# Altium footprint library Cty1.PcbLib: 1378 footprints (part 26 of 87)
Each footprint in its own frame and in the unit in brackets; x right, y up, seen from the top. Pads: shape width x height; smd on the part's side, far side on the other; paste and mask are expansions set on the pad; w line width, h text height; cw(c..) or ccw(c..) is an arc to the next point about the centre after c.
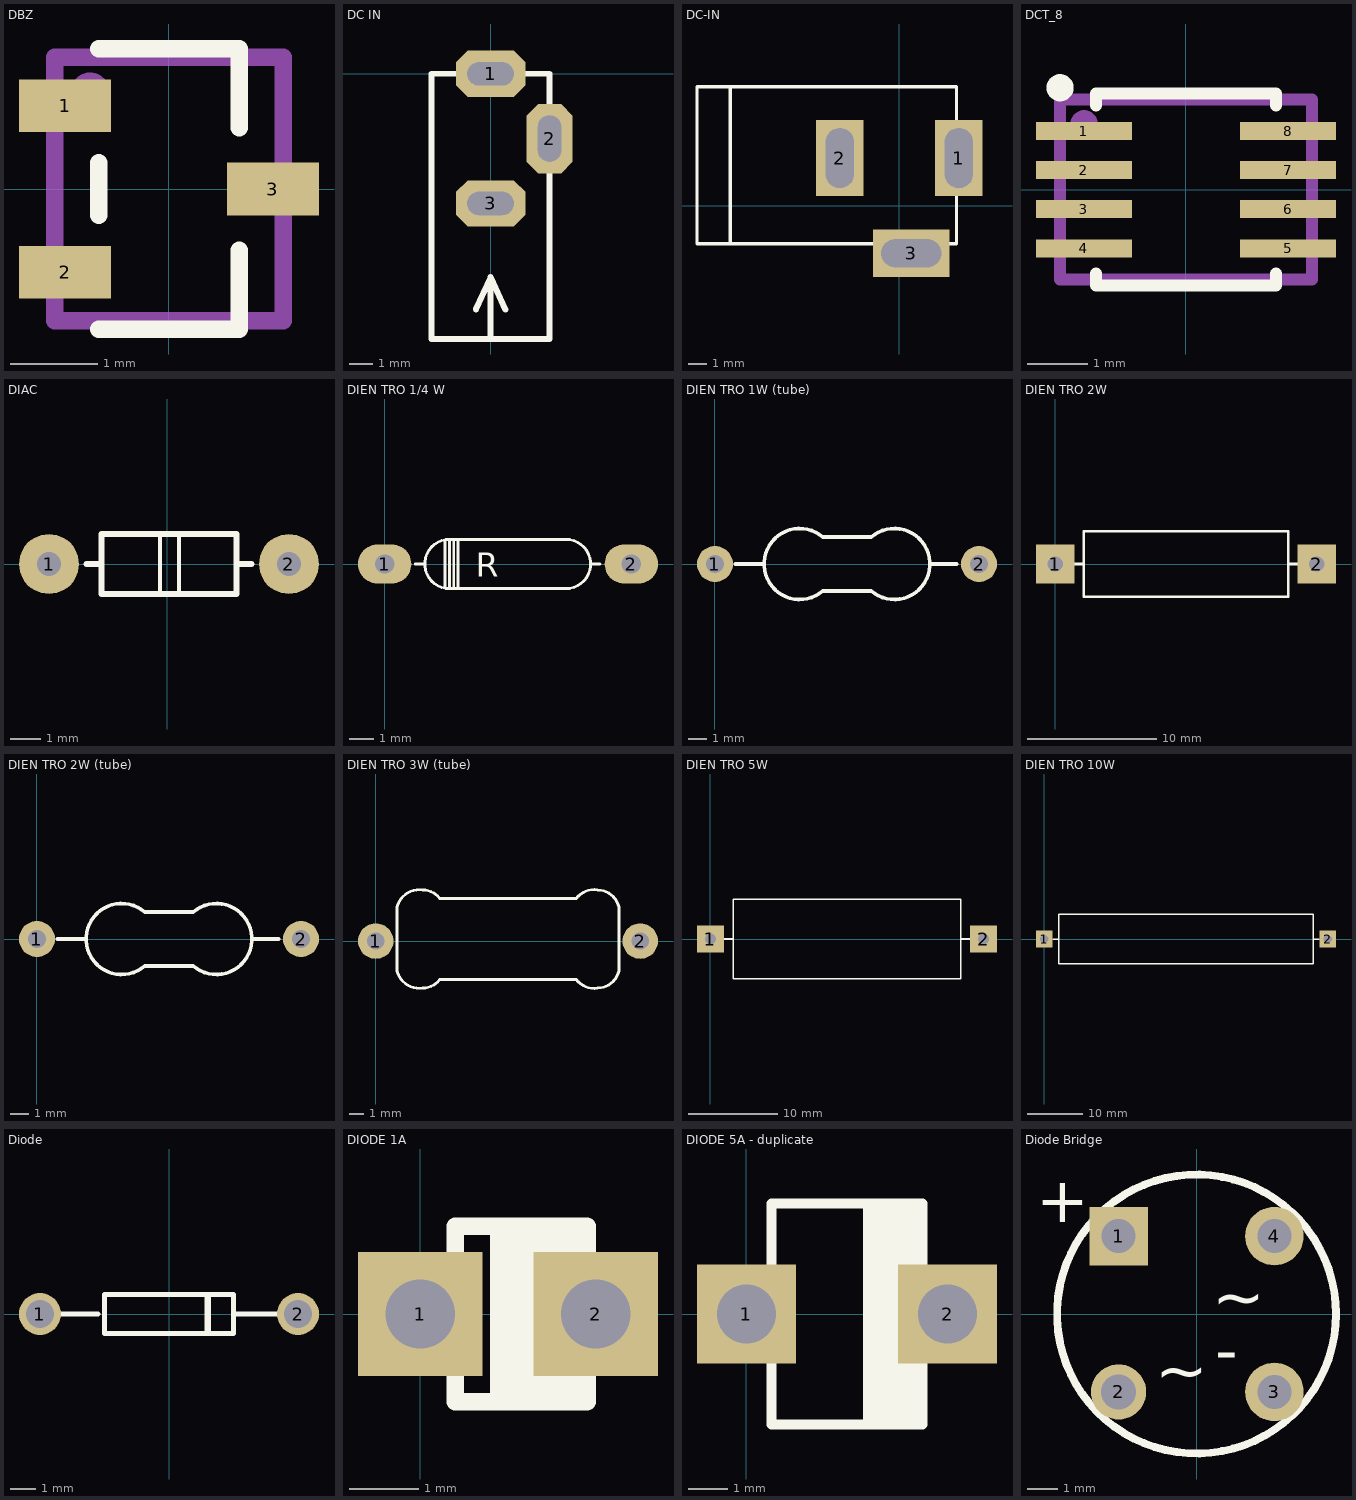
[diagram p25: the footprints below, top view; thin cyan lines are the x and y axes]

## DBZ [mm] "Creator MM"
height 1.12
pads (3):
  rect 1.05x0.6 smd mask+0.07: 1(-1.185,0.95) 2(-1.185,-0.95) 3(1.185,0)
Top Overlay:
  lines w0.2: -0.8,-1.6 0.8,-1.6 0.8,-0.7 ; -0.8,-0.3 -0.8,0.3 ; -0.8,1.6 0.8,1.6 0.8,0.7
Mechanical 16:
  circle w0.254: c-0.9,1.1 r0.1
  lines w0.2: -1.3,-1.5 1.3,-1.5 1.3,1.5 -1.3,1.5 -1.3,-1.5
Mechanical 29:
  text ".Designator" at -0.3,0.7 h0.6
3D body "mf03a.stp": height 0.97, standoff -0.01, extent -1.257,-1.461 1.257,1.46

## DC IN [mm] "Power Header 3mm"
pads (3):
  oct 3x2 hole 1 slot 2 at 0 deg paste-2539.97: 1(0,0) 3(0,-5.588)
  oct 2x3 hole 1 slot 2 at 90 deg paste-2539.97: 2(2.54,-2.794)
Top Overlay:
  lines w0.254: -0.635,-10.16 0,-8.763 ; 0,-11.43 0,-8.763 ; 0.635,-10.16 0,-8.763 ; -2.54,-11.43 2.54,-11.43 2.54,0 -2.54,0 -2.54,-11.43

## DC-IN [mm] "Jac DC input"
height 5.08
pads (3):
  rect 2.54x4.064 hole 1.5 slot 3.2 at 90 deg: 1(3.175,2.54) 2(-3.175,2.54)
  rect 4.064x2.54 hole 1.5 slot 3.2 at 0 deg: 3(0.635,-2.54)
Top Overlay:
  lines w0.178: -9.017,-2.032 -9.017,6.35 ; -10.795,-2.032 -10.795,6.35 3.048,6.35 3.048,-2.032 -10.795,-2.032
3D body "SW3dPS-dc range - dc connector[4840.2201].STEP": height 11.02, standoff -3.48, extent -10.423,-2.67 3.404,6.836

## DCT_8 [mm] "Creator MM"
height 1.3
pads (8):
  rect 1.6x0.3 smd mask+0.07: 1(-1.7,0.975) 2(-1.7,0.325) 3(-1.7,-0.325) 4(-1.7,-0.975) 5(1.7,-0.975) 6(1.7,-0.325) 7(1.7,0.325) 8(1.7,0.975)
Top Overlay:
  circle w0.254: c-2.1,1.7 r0.1
  lines w0.2: -1.5,-1.4 -1.5,-1.6 1.5,-1.6 1.5,-1.4 ; -1.5,1.4 -1.5,1.6 1.5,1.6 1.5,1.4
Mechanical 16:
  circle w0.254: c-1.7,1.1 r0.1
  lines w0.2: -2.1,-1.5 -2.1,1.5 2.1,1.5 2.1,-1.5 -2.1,-1.5
Mechanical 29:
  text ".Designator" at -0.7,-0.5 h0.8
3D body "DCT-8.STEP": height 1.3, standoff 0, extent -2.1,-1.525 2.1,1.525

## DIAC [mm]
pads (2):
  round 2 hole 0.8 mask+0.102: 1(-3.949,0.006) 2(4.051,0.006)
Top Overlay:
  lines w0.127: -0.254,-0.994 -0.254,1.006 ; 0.381,-0.994 0.381,1.006
  lines w0.2: -2.699,0.006 -2.199,0.006 ; 2.301,0.006 2.801,0.006 ; -2.199,-0.994 2.301,-0.994 2.301,1.006 -2.199,1.006 -2.199,-0.994

## DIEN TRO 1/4 W [mm]
pads (2):
  oval 2.2x1.6 hole 0.787: 1(0,0) 2(10.16,0)
Top Overlay:
  lines w0.12: 1.257,0 1.651,0 ; 2.489,-0.978 2.489,0.978 ; 2.591,1.016 7.468,1.016 cw(c7.468,0) 7.468,-1.016 2.667,-1.016 cw(c2.667,0) 2.667,1.016 ; 2.68,-1.016 2.667,-1.003 2.667,1.003 2.68,1.016 ; 2.845,-1.016 2.845,1.016 ; 3.023,-1.003 3.023,0.991 ; 8.484,0 8.877,0
  text "R" at 3.746,-0.521 h1
3D body "SW3dPS-RESISTOR, 0.25 W, 0.4 IN LEAD PITCH.STEP": height 2.93, standoff -2.54, extent -0.305,-1.156 10.465,1.156

## DIEN TRO 1W (tube) [mm] "Dien tro 1W hinh ong"
pads (2):
  round 2 hole 1: 1(0,0) 2(14.707,0)
Top Overlay:
  lines w0.2: 1.143,0 2.701,0 ; 12.006,0 13.462,0
  lines w0.203: 6.003,-1.501 cw(c4.716,0) 6.003,1.501 8.704,1.501 cw(c9.99,0) 8.704,-1.501 6.003,-1.501

## DIEN TRO 2W [mm]
pads (2):
  rect 3x3 hole 1.2: 1(0,0) 2(20.32,0)
Top Overlay:
  lines w0.203: 2.222,-2.54 18.098,-2.54 ; 2.222,-2.54 2.222,2.54 ; 2.222,-2.54 18.098,-2.54 ; 2.222,-2.54 2.222,2.54 ; 2.222,2.54 18.098,2.54 ; 2.222,2.54 18.098,2.54 ; 18.098,-2.54 18.098,2.54 ; 18.098,-2.54 18.098,2.54 ; 1.27,0 2.222,0 1.27,0 ; 18.098,0 19.05,0 18.098,0
3D body: height 5.08, standoff 0, extent 2.222,-2.54 18.098,2.54

## DIEN TRO 2W (tube) [mm] "Dien tro 2W hinh ong"
pads (2):
  round 2 hole 1: 1(0,0) 2(14.707,0)
Top Overlay:
  lines w0.2: 1.143,0 2.701,0 ; 12.006,0 13.462,0
  lines w0.203: 6.003,-1.501 cw(c4.716,0) 6.003,1.501 8.704,1.501 cw(c9.99,0) 8.704,-1.501 6.003,-1.501

## DIEN TRO 3W (tube) [mm] "Dien tro 3W dang ong tru"
pads (2):
  round 2.5 hole 1.2: 1(0,0) 2(18.609,0)
Top Overlay:
  lines w0.2: 3.302,-3.302 cw(c3.062,-1.711) 1.501,-2.101 1.501,2.401 cw(c3.062,2.011) 3.302,3.602 cw(c3.302,2.101) 4.502,3.002 14.107,3.001 cw(c15.357,2.051) 15.607,3.602 cw(c15.586,2.037) 17.108,2.401 17.108,-2.101 cw(c15.586,-1.737) 15.607,-3.302 cw(c15.357,-1.751) 14.107,-2.701 4.502,-2.701 cw(c3.302,-1.801) 3.302,-3.301

## DIEN TRO 5W [mm]
pads (2):
  rect 3x3 hole 1.2: 1(0,0) 2(30.48,0)
Top Overlay:
  lines w0.203: 2.54,-4.445 2.54,4.445 ; 2.54,-4.445 27.94,-4.445 ; 2.54,-4.445 2.54,4.445 ; 2.54,-4.445 27.94,-4.445 ; 2.54,4.445 27.94,4.445 ; 2.54,4.445 27.94,4.445 ; 27.94,-4.445 27.94,4.445 ; 27.94,-4.445 27.94,4.445 ; 1.27,0 2.54,0 1.27,0 ; 27.94,0 29.21,0 27.94,0
3D body: height 7.62, standoff 0, extent 2.54,-4.445 27.94,4.445

## DIEN TRO 10W [mm]
pads (2):
  rect 3x3 hole 1.5: 1(0,0) 2(50.8,0)
Top Overlay:
  lines w0.254: 1.524,0 2.54,0 ; 48.26,0 49.276,0 ; 2.54,-4.445 48.26,-4.445 48.26,4.445 2.54,4.445 2.54,-4.445
3D body: height 7.62, standoff 0, extent 2.54,-4.445 48.26,4.445

## Diode [mil] "Diode"
pads (2):
  round 65 hole 43.31: 1(-200,0) 2(200,0)
Top Overlay:
  lines w7.87: -170,0 -110,0 ; 100,0 200,0 ; -100,-30 -100,30 100,30 100,-30 -100,-30
  lines w10: 60,-27 60,27

## DIODE 1A [mm]
pads (2):
  rect 1.8x1.8 hole 1: 1(0,0) 2(2.54,0)
Top Overlay:
  region: 1.016,1.27 1.778,1.27 1.016,1.27 1.778,1.27 2.413,1.27 1.016,1.27 2.413,1.27 2.413,-1.27 1.778,-1.27 1.016,-1.27 1.016,-1.09
  lines w0.254: 0,0 0.508,0 ; 2.54,0 2.921,0 ; 0.508,-1.27 0.508,1.27 2.413,1.27 2.413,-1.27 0.508,-1.27
3D body "User Library-Diod DO-41 Vertical.STEP": height 10.64, standoff -3.5, extent -0.43,-1.365 3.905,1.365

## DIODE 5A - duplicate [mm]
pads (2):
  rect 2.5x2.5 hole 1.5: 1(0,0) 2(5.08,0)
Top Overlay:
  region: 3.048,2.794 4.445,2.794 4.445,-2.794 3.048,-2.794
  lines w0.2: 3.048,-2.794 3.048,2.794
  lines w0.254: 0,0 0.635,0 ; 4.445,0 5.08,0 ; 0.635,-2.794 0.635,2.794 4.445,2.794 4.445,-2.794 0.635,-2.794
3D body "User Library-Diod DO-201AD Vertical.STEP": height 15.19, standoff -3.5, extent -0.66,-2.805 7.885,2.805

## Diode Bridge [mm] "Bridge Rectifier; 4 Terminals; Body 9.4 x 9.4 mm (typ); Pitch 5.08 mm"
height 0.14
pads (4):
  rect 1.905x1.905 hole 1.1: 1(-2.54,2.54)
  round 1.8 hole 1.143: 2(-2.54,-2.54)
  round 1.905 hole 1.1: 3(2.54,-2.54) 4(2.54,2.54)
Top Overlay:
  circle w0.254: c0,0 r4.547
  text "~" at 0.508,-0.178 h1.5
  text "~" at -1.346,-2.565 h1.5
  text "-" at 0.61,-1.905 h1.5
  text "+" at -5.232,2.997 h1.5
3D body "User Library-Silicon Bridge Rectifiers 2W10.STEP": height 12, standoff -6, extent -4.5,-4.55 4.5,4.45